# Altium footprint library EDR.PcbLib: 85 footprints (part 3 of 6)
Each footprint in its own frame and in the unit in brackets; x right, y up, seen from the top. Pads: shape width x height; smd on the part's side, far side on the other; paste and mask are expansions set on the pad; w line width, h text height; cw(c..) or ccw(c..) is an arc to the next point about the centre after c.
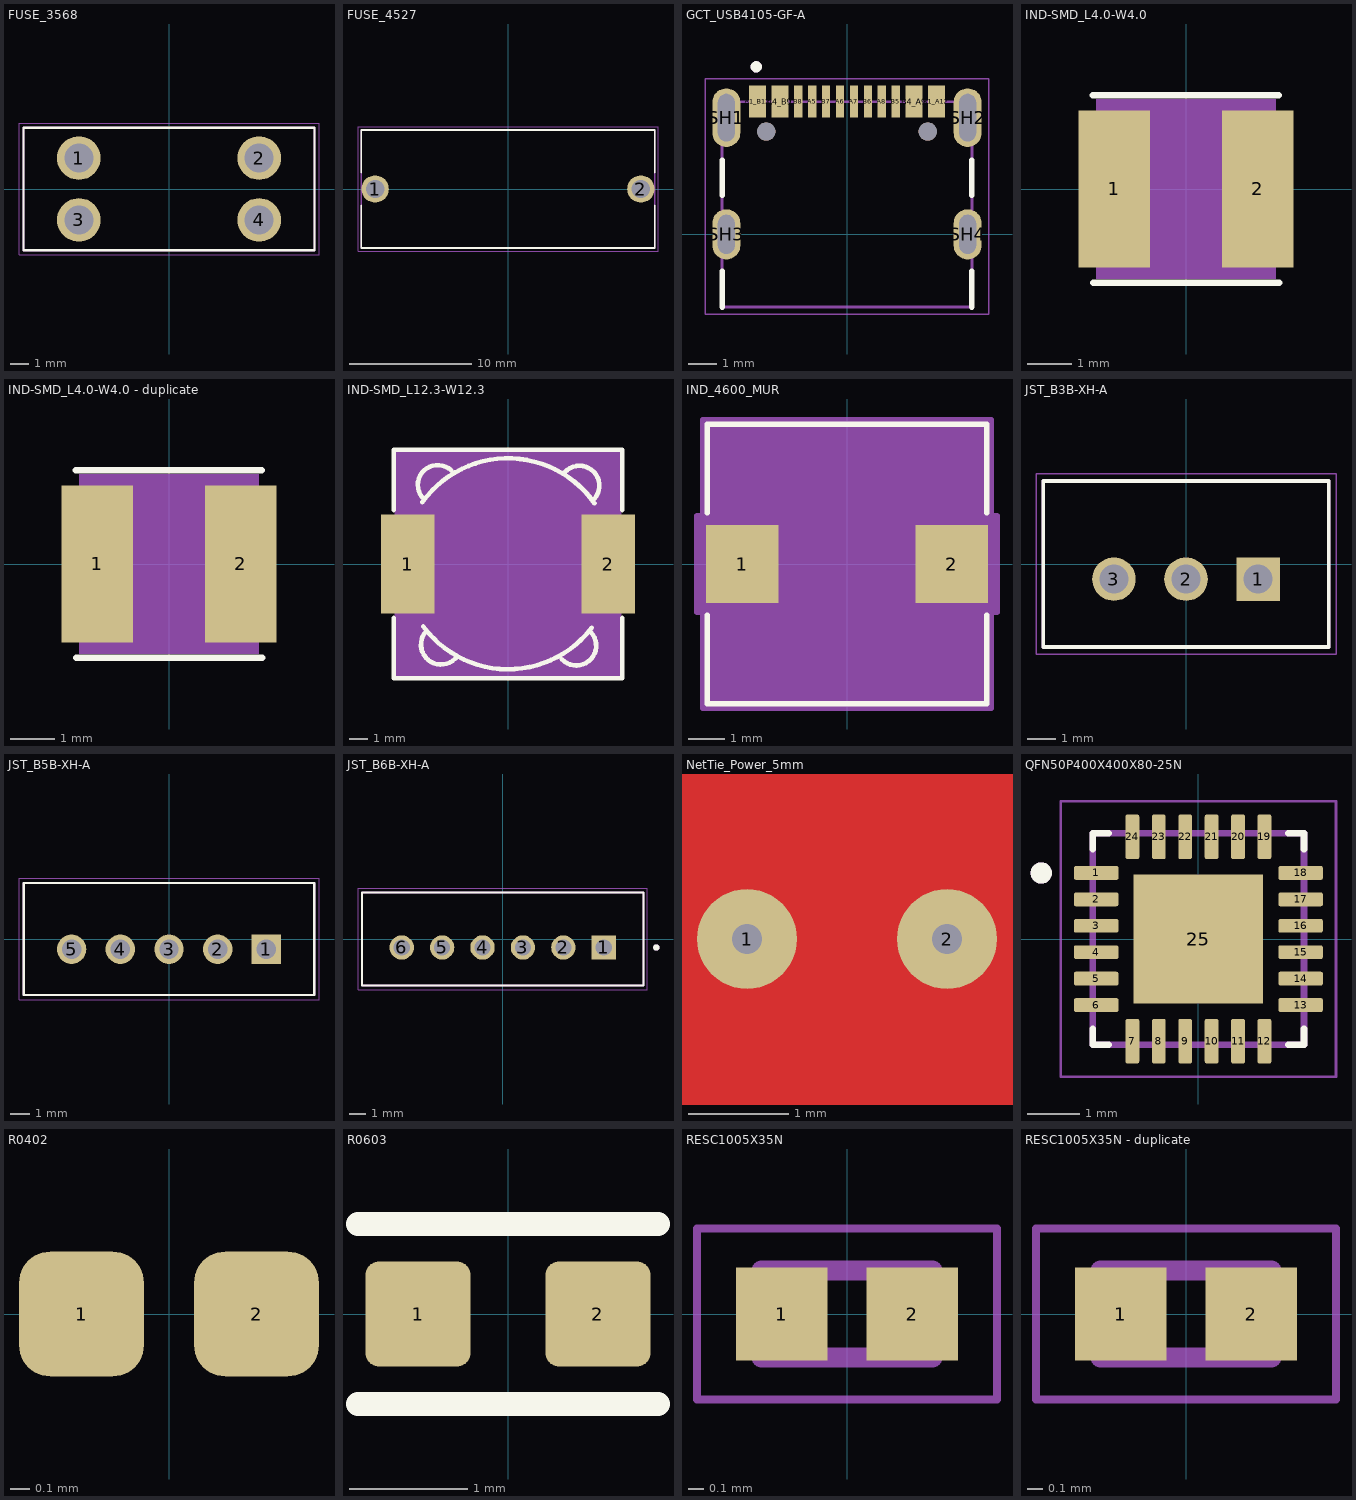
[diagram p2: the footprints below, top view; thin cyan lines are the x and y axes]

## FUSE_3568 [mm]
height 7.37
pads (4):
  round 2.4 hole 1.6: 1(-4.96,1.7) 2(4.96,1.7) 3(-4.96,-1.7) 4(4.96,-1.7)
Top Overlay:
  lines w0.127: -8,-3.365 -8,3.365 8,3.365 8,-3.365 -8,-3.365
Top 3D Body:
  lines w0.127: -8,-3.365 -8,3.365 8,3.365 8,-3.365 -8,-3.365
Top Courtyard:
  lines w0.05: -8.25,-3.615 -8.25,3.615 8.25,3.615 8.25,-3.615 -8.25,-3.615
3D body "step_temp.STEP": height 7.36, standoff -2.8, extent -8.044,-3.432 7.958,3.299

## FUSE_4527 [mm]
height 10.8
pads (2):
  round 2.25 hole 1.5: 1(-10.92,0) 2(10.92,0)
Top Overlay:
  lines w0.127: -12.08,-1.32 -12.08,-4.85 12.08,-4.85 12.08,-1.32 ; -12.08,1.32 -12.08,4.85 12.08,4.85 12.08,1.32
Top 3D Body:
  lines w0.127: -12.08,-4.85 12.08,-4.85 12.08,4.85 -12.08,4.85 -12.08,-4.85
Top Courtyard:
  lines w0.05: -12.33,-5.1 12.33,-5.1 12.33,5.1 -12.33,5.1 -12.33,-5.1
3D body "step_temp.STEP": height 10.79, standoff -4.17, extent -12.078,-4.851 12.078,4.851

## GCT_USB4105-GF-A [mm]
height 3.31
pads (18):
  rect 0.6x1.15 smd mask+0.04: A1_B12(-3.2,4.755) B1_A12(3.2,4.755)
  rect 0.6x1.15 smd mask+0.05: A4_B9(-2.4,4.755) B4_A9(2.4,4.755)
  rect 0.3x1.15 smd mask+0.05: A5(-1.25,4.755) A6(-0.25,4.755) A7(0.25,4.755) A8(1.25,4.755) B5(1.75,4.755) B6(0.75,4.755) B7(-0.75,4.755) B8(-1.75,4.755)
  oval 1x2.1 hole 0.6 slot 1.7 at 90 deg: SH1(-4.32,4.18) SH2(4.32,4.18)
  oval 1x1.8 hole 0.6 slot 1.4 at 90 deg: SH3(-4.32,0) SH4(4.32,0)
  round 0.65 hole 0.65 unplated mask+0.03: ""(-2.89,3.68) ""(2.89,3.68)
Top Overlay:
  circle w0.2: c-3.25,6 r0.1
  lines w0.2: -4.47,-2.6 -4.47,-1.32 ; -4.47,1.4 -4.47,2.65 ; 4.47,-2.6 4.47,-1.32 ; 4.47,1.4 4.47,2.65
Top 3D Body:
  circle w0.2: c-3.25,6 r0.1
  lines w0.1: -4.47,-2.6 -4.47,4.75 4.47,4.75 4.47,-2.6 -4.47,-2.6
Top Courtyard:
  lines w0.05: -5.07,-2.85 5.07,-2.85 5.07,5.58 -5.07,5.58 -5.07,-2.85
3D body "USB4105-GF-A.STEP": height 3.31, standoff -1.1, extent -4.47,-2.575 4.47,5.135

## IND-SMD_L4.0-W4.0 [mm]
pads (2):
  rect 1.6x3.5 smd: 1(-1.6,0) 2(1.6,0)
Top Overlay:
  lines w0.15: -2.083,2.096 2.07,2.096 ; -2.07,-2.096 2.082,-2.096
Top Assembly:
  region: 1.05,1.65 2,1.65 2,-1.65 1.05,-1.65
  region: -2,1.65 -1.05,1.65 -1.05,-1.65 -2,-1.65
Top Courtyard:
  region: -2,-2 -2,2 2,2 2,-2
3D body "3u3H.STEP": height 4.87, standoff 0.44, extent -3.25,-3 3.25,3

## IND-SMD_L4.0-W4.0 - duplicate [mm]
pads (2):
  rect 1.6x3.5 smd: 1(-1.6,0) 2(1.6,0)
Top Overlay:
  lines w0.15: -2.083,2.096 2.07,2.096 ; -2.07,-2.096 2.082,-2.096
Top Assembly:
  region: -2,1.65 -1.05,1.65 -1.05,-1.65 -2,-1.65
  region: 1.05,1.65 2,1.65 2,-1.65 1.05,-1.65
Top Courtyard:
  region: -2,-2 -2,2 2,2 2,-2
3D body "3u3H.STEP": height 4.87, standoff 0.44, extent -3.25,-3 3.25,3

## IND-SMD_L12.3-W12.3 [mm]
pads (2):
  rect 2.9x5.4 smd: 1(-5.45,0) 2(5.45,0)
Top Overlay:
  lines w0.254: -6.2,-2.931 -6.2,-6.2 6.2,-6.2 6.2,-2.931 ; -6.2,2.931 -6.2,6.2 6.2,6.2 6.2,2.931 ; -4.666,3.348 cw(c0,0) 4.7,3.3 ; -4.6,-3.4 ccw(c0,0) 4.552,-3.464 ; -4.55,3.504 cw(c-3.822,4.299) -3.1,5.1 ; -4.534,-3.759 ccw(c-3.641,-4.378) -2.758,-5.011 ; 2.927,-5.176 ccw(c3.711,-4.435) 4.5,-3.7 ; 3.087,4.988 cw(c3.882,4.26) 4.683,3.538
Top Assembly:
  region: 3.9,2.5 6.1,2.5 6.1,-2.5 3.9,-2.5
  region: -6.1,2.5 -3.9,2.5 -3.9,-2.5 -6.1,-2.5
Top Courtyard:
  region: -6.15,-6.15 -6.15,6.15 6.15,6.15 6.15,-6.15
3D body "CDRH127NP-330MC.STEP": height 8, standoff 0, extent -6,-6 6,6

## IND_4600_MUR [mil]
pads (2):
  rect 79x85 smd paste+0 mask+0: 1(-114,0) 2(114,0)
Top Overlay:
  lines w6: -152.5,-55.6 -152.5,-152.5 152.5,-152.5 152.5,-55.6 ; -152.5,55.6 -152.5,152.5 152.5,152.5 152.5,55.6
Top 3D Body:
  lines w1: -147.5,-73.75 -73.75,-147.5 ; -147.5,73.75 -73.75,147.5 ; -147.5,-147.5 147.5,-147.5 147.5,147.5 -147.5,147.5 -147.5,-147.5
Top Courtyard:
  region: -157.5,-52.5 -163.5,-52.5 -163.5,52.5 -157.5,52.5 -157.5,157.5 157.5,157.5 157.5,52.5 163.5,52.5 163.5,-52.5 157.5,-52.5 157.5,-157.5 -157.5,-157.5
  region: 147.5,-147.5 -147.5,-147.5 -147.5,147.5 147.5,147.5
  lines w6: -163.5,-52.5 -163.5,52.5 -157.5,52.5 -157.5,157.5 157.5,157.5 157.5,52.5 163.5,52.5 163.5,-52.5 157.5,-52.5 157.5,-157.5 -157.5,-157.5 -157.5,-52.5 -163.5,-52.5
3D body "IND_4600_MUR.step": height 179.02, standoff 0, extent -147.48,-147.48 147.48,147.48

## JST_B3B-XH-A [mm]
height 7
pads (3):
  rect 1.508x1.508 / inner round 1.508 / far side rect 1.508x1.508 hole 1 mask+0.102: 1(2.5,-0.525)
  round 1.508 hole 1 mask+0.102: 2(0,-0.525) 3(-2.5,-0.525)
Top Overlay:
  lines w0.127: -4.95,-2.875 -4.95,2.875 4.95,2.875 4.95,-2.875 -4.95,-2.875
Top 3D Body:
  lines w0.127: -4.95,-2.875 -4.95,2.875 4.95,2.875 4.95,-2.875 -4.95,-2.875
Top Courtyard:
  lines w0.05: -5.2,-3.125 -5.2,3.125 5.2,3.125 5.2,-3.125 -5.2,-3.125
3D body "step_temp.STEP": height 7, standoff -3.4, extent -4.95,-2.875 4.95,2.875

## JST_B5B-XH-A [mm]
height 7
pads (5):
  rect 1.508x1.508 / inner round 1.508 / far side rect 1.508x1.508 hole 1: 1(5,-0.525)
  round 1.508 hole 1: 2(2.5,-0.525) 3(0,-0.525) 4(-2.5,-0.525) 5(-5,-0.525)
Top Overlay:
  lines w0.127: -7.45,-2.875 -7.45,2.875 7.45,2.875 7.45,-2.875 -7.45,-2.875
Top 3D Body:
  lines w0.127: -7.45,-2.875 -7.45,2.875 7.45,2.875 7.45,-2.875 -7.45,-2.875
Top Courtyard:
  lines w0.05: -7.7,-3.125 -7.7,3.125 7.7,3.125 7.7,-3.125 -7.7,-3.125
3D body "step_temp.STEP": height 7, standoff -3.4, extent -7.45,-2.875 7.45,2.875

## JST_B6B-XH-A [mm]
height 7
pads (6):
  rect 1.508x1.508 / inner round 1.508 / far side rect 1.508x1.508 hole 1: 1(6.25,-0.525)
  round 1.508 hole 1: 2(3.75,-0.525) 3(1.25,-0.525) 4(-1.25,-0.525) 5(-3.75,-0.525) 6(-6.25,-0.525)
Top Overlay:
  circle w0.2: c9.5,-0.525 r0.1
  lines w0.127: -8.7,-2.875 -8.7,2.875 8.7,2.875 8.7,-2.875 -8.7,-2.875
Top 3D Body:
  circle w0.2: c9.5,-0.525 r0.1
  lines w0.127: -8.7,-2.875 -8.7,2.875 8.7,2.875 8.7,-2.875 -8.7,-2.875
Top Courtyard:
  lines w0.05: -8.95,-3.125 -8.95,3.125 8.95,3.125 8.95,-3.125 -8.95,-3.125
3D body "B6B-XH-A.STEP": height 7, standoff -3.4, extent -8.7,-2.875 8.7,2.875

## NetTie_Power_5mm [mm]
pads (2):
  round 1 hole 0.3 paste-2539.97 mask-1: 1(0,0) 2(2,0)
Top Layer:
  lines w8: 0,0 2,0

## QFN50P400X400X80-25N [mm]
pads (25):
  rrect25% 0.84x0.26 smd mask+0.05: 1(-1.935,1.25) 2(-1.935,0.75) 3(-1.935,0.25) 4(-1.935,-0.25) 5(-1.935,-0.75) 6(-1.935,-1.25) 13(1.935,-1.25) 14(1.935,-0.75) 15(1.935,-0.25) 16(1.935,0.25) 17(1.935,0.75) 18(1.935,1.25)
  rrect25% 0.26x0.84 smd mask+0.05: 7(-1.25,-1.935) 8(-0.75,-1.935) 9(-0.25,-1.935) 10(0.25,-1.935) 11(0.75,-1.935) 12(1.25,-1.935) 19(1.25,1.935) 20(0.75,1.935) 21(0.25,1.935) 22(-0.25,1.935) 23(-0.75,1.935) 24(-1.25,1.935)
  rect 2.45x2.45 smd paste-0.455 mask+0.08: 25(0,0)
Top Overlay:
  circle w0.2: c-2.975,1.25 r0.1
  lines w0.127: -2,-1.7 -2,-2 -1.7,-2 ; -2,1.7 -2,2 -1.7,2 ; 1.7,-2 2,-2 2,-1.7 ; 1.7,2 2,2 2,1.7
Top 3D Body:
  circle w0.2: c-2.975,1.25 r0.1
  lines w0.127: -2,-2 -2,2 2,2 2,-2 -2,-2
Top Courtyard:
  lines w0.05: -2.605,-2.605 -2.605,2.605 2.605,2.605 2.605,-2.605 -2.605,-2.605

## R0402 [mil]
pads (2):
  rrect50% 25x25 smd mask+2.95: 1(-17.5,0) 2(17.5,0)
3D body "step_temp.STEP": height 15.75, standoff 0, extent -19.68,-9.84 19.68,9.84

## R0603 [mil]
pads (2):
  rrect25% 35x35 smd: 1(-30,0) 2(30,0)
Top Overlay:
  lines w7.87: -50,-30 50,-30 ; -50,30 50,30
3D body "step_temp.STEP": height 21.65, standoff 0, extent -31.5,-15.75 31.5,15.75

## RESC1005X35N [mm]
pads (2):
  rect 0.59x0.6 smd mask+0.07: 1(-0.42,0) 2(0.42,0)
Top 3D Body:
  lines w0.127: -0.55,-0.28 -0.55,0.28 0.55,0.28 0.55,-0.28 -0.55,-0.28
Top Courtyard:
  lines w0.05: -0.965,-0.55 -0.965,0.55 0.965,0.55 0.965,-0.55 -0.965,-0.55
3D body "step_temp.STEP": height 0.4, standoff 0, extent -0.5,-0.25 0.5,0.25

## RESC1005X35N - duplicate [mm]
pads (2):
  rect 0.59x0.6 smd: 1(-0.42,0) 2(0.42,0)
Top 3D Body:
  lines w0.127: -0.55,-0.28 -0.55,0.28 0.55,0.28 0.55,-0.28 -0.55,-0.28
Top Courtyard:
  lines w0.05: -0.965,-0.55 -0.965,0.55 0.965,0.55 0.965,-0.55 -0.965,-0.55